# Altium footprint library 3.22-杂项.PcbLib: 199 footprints (part 3 of 15)
Each footprint in its own frame and in the unit in brackets; x right, y up, seen from the top. Pads: shape width x height; smd on the part's side, far side on the other; paste and mask are expansions set on the pad; w line width, h text height; cw(c..) or ccw(c..) is an arc to the next point about the centre after c.
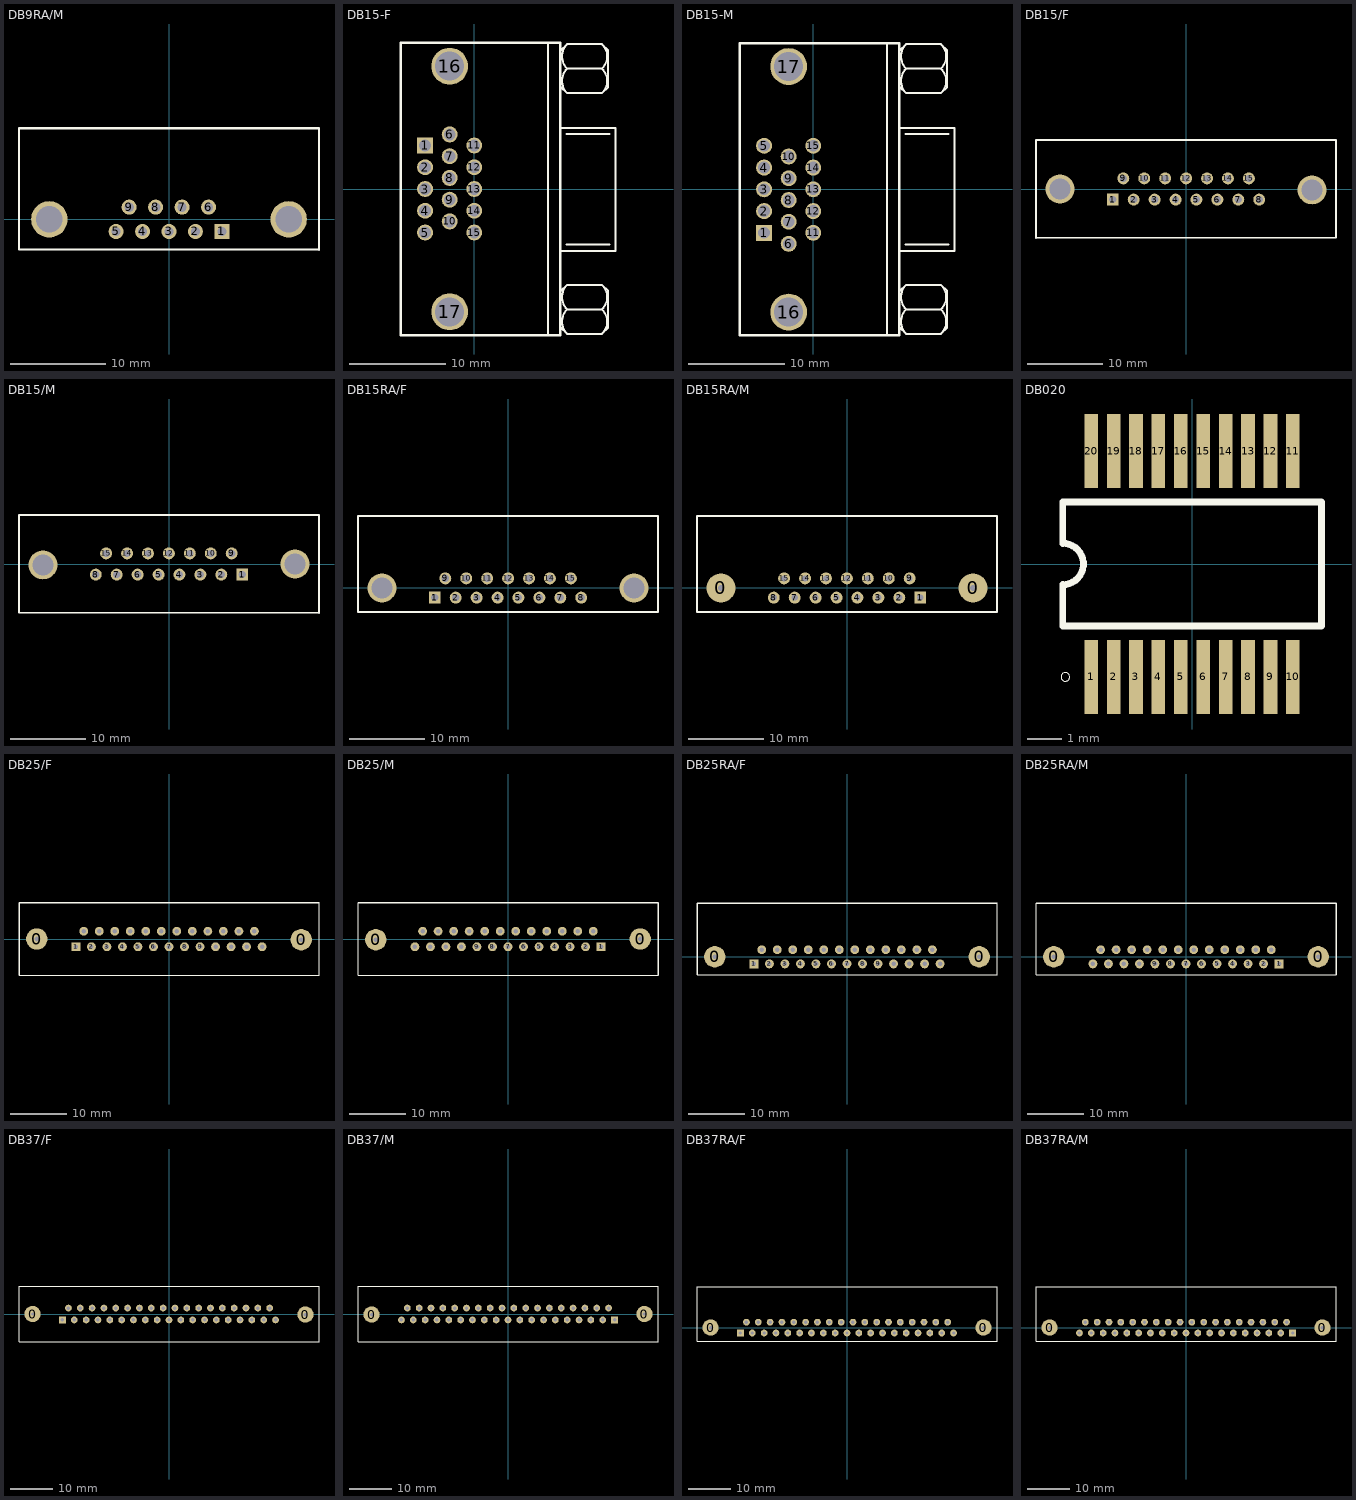
[diagram p2: the footprints below, top view; thin cyan lines are the x and y axes]

## DB9RA/M [mil] "[ PCBѧϰȺ514746572 ]"
pads (11):
  rect 62x62 hole 38: 1(218,-50)
  round 62 hole 38: 2(109,-50) 3(0,-50) 4(-109,-50) 5(-218,-50) 6(163,50) 7(54,50) 8(-55,50) 9(-164,50)
  round 150 hole 110: ""(-493,0) ""(493,0)
Top Overlay:
  lines w8: -618,375 -618,-125 618,-125
  lines w10: -618,375 618,375 618,-125

## DB15-F [mil] "VGAĸ      [ PCBѧϰȺ514746572 ]"
height 393.7
pads (17):
  rect 65x65 hole 48: 1(-200,177.16)
  round 65 hole 48: 2(-200,88.58) 3(-200,0) 4(-200,-88.58) 5(-200,-177.16) 6(-100,222.17) 7(-100,133.58) 8(-100,45) 9(-100,-43.58) 10(-100,-132.16) 11(0,177.16) 12(0,88.58) 13(0,0) 14(0,-88.58) 15(0,-177.16)
  round 150 hole 118.11: 16(-100,500) 17(-100,-500)
Top Overlay:
  lines w8: 300,-595 300,596.25 ; 350,-251.67 575,-251.67 575,248.33 350,248.33 ; 353.33,-565 378.33,-590 520,-590 545,-565 545,-415 520,-390 378.33,-390 353.33,-415 ; 353.33,415 378.33,390 520,390 545,415 545,565 520,590 378.33,590 353.33,565 ; 375,-226.67 550,-226.67 ; 375,223.33 550,223.33 ; 378.25,-590.09 cw(c428.33,-540) 378.25,-489.91 ; 378.25,-490.09 cw(c428.33,-440) 378.25,-389.91 ; 378.25,389.91 cw(c428.33,440) 378.25,490.09 ; 378.25,489.91 cw(c428.33,540) 378.25,590.09 ; 378.33,-490 520,-490 ; 378.33,490 520,490 ; 520.09,-590.09 ccw(c470,-540) 520.09,-489.91 ; 520.09,-490.09 ccw(c470,-440) 520.09,-389.91 ; 520.09,389.91 ccw(c470,440) 520.09,490.09 ; 520.09,489.91 ccw(c470,540) 520.09,590.09
  lines w10: -300,-595 350,-595 350,595 -300,595 -300,-595

## DB15-M [mil] "VGA公      [ PCB学习群514746572 ]"
height 393.7
pads (17):
  rect 65x65 hole 48: 1(-200,-177.16)
  round 65 hole 48: 2(-200,-88.58) 3(-200,0) 4(-200,88.58) 5(-200,177.16) 6(-100,-222) 7(-100,-132.16) 8(-100,-43.58) 9(-100,45) 10(-100,133.58) 11(0,-177.16) 12(0,-88.58) 13(0,0) 14(0,88.58) 15(0,177.16)
  round 150 hole 118.11: 16(-100,-500) 17(-100,500)
Top Overlay:
  lines w8: 300,-596.25 300,595 ; 350,-250.42 575,-250.42 575,249.58 350,249.58 ; 353.33,-563.75 378.33,-588.75 520,-588.75 545,-563.75 545,-413.75 520,-388.75 378.33,-388.75 353.33,-413.75 ; 353.33,416.25 378.33,391.25 520,391.25 545,416.25 545,566.25 520,591.25 378.33,591.25 353.33,566.25 ; 375,-225.42 550,-225.42 ; 375,224.58 550,224.58 ; 378.25,-588.84 cw(c428.33,-538.75) 378.25,-488.66 ; 378.25,-488.84 cw(c428.33,-438.75) 378.25,-388.66 ; 378.25,391.16 cw(c428.33,441.25) 378.25,491.34 ; 378.25,491.16 cw(c428.33,541.25) 378.25,591.34 ; 378.33,-488.75 520,-488.75 ; 378.33,491.25 520,491.25 ; 520.09,-588.84 ccw(c470,-538.75) 520.09,-488.66 ; 520.09,-488.84 ccw(c470,-438.75) 520.09,-388.66 ; 520.09,391.16 ccw(c470,441.25) 520.09,491.34 ; 520.09,491.16 ccw(c470,541.25) 520.09,591.34
  lines w10: -300,-595 -300,595 350,595 350,-595 -300,-595

## DB15/F [mil] "[ PCBѧϰȺ514746572 ]"
pads (17):
  rect 62x62 hole 38: 1(-381.5,-55)
  round 62 hole 38: 2(-272.5,-55) 3(-163.5,-55) 4(-54.5,-55) 5(54.5,-55) 6(163.5,-55) 7(272.5,-55) 8(381.5,-55) 9(-326.5,55) 10(-217.5,55) 11(-108.5,55) 12(0.5,55) 13(109.5,55) 14(218.5,55) 15(327.5,55)
  round 150 hole 110: ""(-656.5,0) ""(656.5,-5)
Top Overlay:
  lines w8: -781.5,-255 781.5,-255 781.5,255
  lines w10: -781.5,-255 -781.5,255 781.5,255

## DB15/M [mil] "[ PCBѧϰȺ514746572 ]"
pads (17):
  rect 62x62 hole 38: 1(381.5,-55)
  round 62 hole 38: 2(272.5,-55) 3(163.5,-55) 4(54.5,-55) 5(-54.5,-55) 6(-163.5,-55) 7(-272.5,-55) 8(-381.5,-55) 9(326.5,55) 10(217.5,55) 11(108.5,55) 12(-0.5,55) 13(-109.5,55) 14(-218.5,55) 15(-327.5,55)
  round 150 hole 110: ""(-656.5,-5) ""(656.5,0)
Top Overlay:
  lines w8: -781.5,255 -781.5,-255 781.5,-255
  lines w10: -781.5,255 781.5,255 781.5,-255

## DB15RA/F [mil] "[ PCBѧϰȺ514746572 ]"
pads (17):
  rect 62x62 hole 38: 1(-381.5,-50)
  round 62 hole 38: 2(-272.5,-50) 3(-163.5,-50) 4(-54.5,-50) 5(54.5,-50) 6(163.5,-50) 7(272.5,-50) 8(381.5,-50) 9(-326.5,50) 10(-217.5,50) 11(-108.5,50) 12(0.5,50) 13(109.5,50) 14(218.5,50) 15(327.5,50)
  round 150 hole 110: ""(-656.5,0) ""(656.5,0)
Top Overlay:
  lines w8: -781.5,-125 781.5,-125 781.5,375
  lines w10: -781.5,-125 -781.5,375 781.5,375

## DB15RA/M [mil] "[ PCBѧϰȺ514746572 ]"
pads (17):
  round 150 hole 32: 0(-656.5,0) 0(656.5,0)
  rect 62x62 hole 32: 1(381.5,-50)
  round 62 hole 32: 2(272.5,-50) 3(163.5,-50) 4(54.5,-50) 5(-54.5,-50) 6(-163.5,-50) 7(-272.5,-50) 8(-381.5,-50) 9(326.5,50) 10(217.5,50) 11(108.5,50) 12(-0.5,50) 13(-109.5,50) 14(-218.5,50) 15(-327.5,50)
Top Overlay:
  lines w8: -781.5,375 -781.5,-125 781.5,-125
  lines w10: -781.5,375 781.5,375 781.5,-125

## DB020 [mm] "Plastic SSOP; 20 Leads; Body Width 5.3 mm; Pitch 0.65 mm      [ PCBѧϰȺ514746572 ]"
height 2
pads (20):
  rect 0.396x2.15 smd: 1(-2.925,-3.275) 2(-2.275,-3.275) 3(-1.625,-3.275) 4(-0.975,-3.275) 5(-0.325,-3.275) 6(0.325,-3.275) 7(0.975,-3.275) 8(1.625,-3.275) 9(2.275,-3.275) 10(2.925,-3.275) 11(2.925,3.275) 12(2.275,3.275) 13(1.625,3.275) 14(0.975,3.275) 15(0.325,3.275) 16(-0.325,3.275) 17(-0.975,3.275) 18(-1.625,3.275) 19(-2.275,3.275) 20(-2.925,3.275)
Top Overlay:
  circle w0.025: c-3.675,-3.275 r0.125
  lines w0.2: -3.75,-1.8 -3.75,-0.6 ccw(c-3.75,0) -3.75,0.6 -3.75,1.8 3.75,1.8 3.75,-1.8 -3.75,-1.8

## DB25/F [mil] "[ PCBѧϰȺ514746572 ]"
pads (27):
  round 150 hole 32: 0(-929,0) 0(929,-5)
  rect 62x62 hole 32: 1(-654,-55)
  round 62 hole 32: 2(-545,-55) 3(-436,-55) 4(-327,-55) 5(-218,-55) 6(-109,-55) 7(0,-55) 8(109,-55) 9(218,-55) 10(327,-55) 11(436,-55) 12(545,-55) 13(654,-55) 14(-599,55) 15(-490,55) 16(-381,55) 17(-272,55) 18(-163,55) 19(-54,55) 20(55,55) 21(164,55) 22(273,55) 23(382,55) 24(491,55) 25(600,55)
Top Overlay:
  lines w8: -1054,-255 1054,-255 1054,255
  lines w10: -1054,-255 -1054,255 1054,255

## DB25/M [mil] "[ PCBѧϰȺ514746572 ]"
pads (27):
  round 150 hole 32: 0(-929,-5) 0(929,0)
  rect 62x62 hole 32: 1(654,-55)
  round 62 hole 32: 2(545,-55) 3(436,-55) 4(327,-55) 5(218,-55) 6(109,-55) 7(0,-55) 8(-109,-55) 9(-218,-55) 10(-327,-55) 11(-436,-55) 12(-545,-55) 13(-654,-55) 14(599,55) 15(490,55) 16(381,55) 17(272,55) 18(163,55) 19(54,55) 20(-55,55) 21(-164,55) 22(-273,55) 23(-382,55) 24(-491,55) 25(-600,55)
Top Overlay:
  lines w8: -1054,255 -1054,-255 1054,-255
  lines w10: -1054,255 1054,255 1054,-255

## DB25RA/F [mil] "[ PCBѧϰȺ514746572 ]"
pads (27):
  round 150 hole 32: 0(-929,0) 0(929,0)
  rect 62x62 hole 32: 1(-654,-50)
  round 62 hole 32: 2(-545,-50) 3(-436,-50) 4(-327,-50) 5(-218,-50) 6(-109,-50) 7(0,-50) 8(109,-50) 9(218,-50) 10(327,-50) 11(436,-50) 12(545,-50) 13(654,-50) 14(-599,50) 15(-490,50) 16(-381,50) 17(-272,50) 18(-163,50) 19(-54,50) 20(55,50) 21(164,50) 22(273,50) 23(382,50) 24(491,50) 25(600,50)
Top Overlay:
  lines w8: -1054,-125 1054,-125 1054,375
  lines w10: -1054,-125 -1054,375 1054,375

## DB25RA/M [mil] "[ PCBѧϰȺ514746572 ]"
pads (27):
  round 150 hole 32: 0(-929,0) 0(929,0)
  rect 62x62 hole 32: 1(654,-50)
  round 62 hole 32: 2(545,-50) 3(436,-50) 4(327,-50) 5(218,-50) 6(109,-50) 7(0,-50) 8(-109,-50) 9(-218,-50) 10(-327,-50) 11(-436,-50) 12(-545,-50) 13(-654,-50) 14(599,50) 15(490,50) 16(381,50) 17(272,50) 18(163,50) 19(54,50) 20(-55,50) 21(-164,50) 22(-273,50) 23(-382,50) 24(-491,50) 25(-600,50)
Top Overlay:
  lines w8: -1054,375 -1054,-125 1054,-125
  lines w10: -1054,375 1054,375 1054,-125

## DB37/F [mil] "[ PCBѧϰȺ514746572 ]"
pads (39):
  round 150 hole 32: 0(-1256,0) 0(1256,-5)
  rect 62x62 hole 32: 1(-981,-55)
  round 62 hole 32: 2(-872,-55) 3(-763,-55) 4(-654,-55) 5(-545,-55) 6(-436,-55) 7(-327,-55) 8(-218,-55) 9(-109,-55) 10(0,-55) 11(109,-55) 12(218,-55) 13(327,-55) 14(436,-55) 15(545,-55) 16(654,-55) 17(763,-55) 18(872,-55) 19(981,-55) 20(-926,55) 21(-817,55) 22(-708,55) 23(-599,55) 24(-490,55) 25(-381,55) 26(-272,55) 27(-163,55) 28(-54,55) 29(55,55) 30(164,55) 31(273,55) 32(382,55) 33(491,55) 34(600,55) 35(709,55) 36(818,55) 37(927,55)
Top Overlay:
  lines w8: -1381,-255 1381,-255 1381,255
  lines w10: -1381,-255 -1381,255 1381,255

## DB37/M [mil] "[ PCBѧϰȺ514746572 ]"
pads (39):
  round 150 hole 32: 0(-1256,-5) 0(1256,0)
  rect 62x62 hole 32: 1(981,-55)
  round 62 hole 32: 2(872,-55) 3(763,-55) 4(654,-55) 5(545,-55) 6(436,-55) 7(327,-55) 8(218,-55) 9(109,-55) 10(0,-55) 11(-109,-55) 12(-218,-55) 13(-327,-55) 14(-436,-55) 15(-545,-55) 16(-654,-55) 17(-763,-55) 18(-872,-55) 19(-981,-55) 20(926,55) 21(817,55) 22(708,55) 23(599,55) 24(490,55) 25(381,55) 26(272,55) 27(163,55) 28(54,55) 29(-55,55) 30(-164,55) 31(-273,55) 32(-382,55) 33(-491,55) 34(-600,55) 35(-709,55) 36(-818,55) 37(-927,55)
Top Overlay:
  lines w8: -1381,255 -1381,-255 1381,-255
  lines w10: -1381,255 1381,255 1381,-255

## DB37RA/F [mil] "[ PCBѧϰȺ514746572 ]"
pads (39):
  round 150 hole 32: 0(-1256,0) 0(1256,0)
  rect 62x62 hole 32: 1(-981,-50)
  round 62 hole 32: 2(-872,-50) 3(-763,-50) 4(-654,-50) 5(-545,-50) 6(-436,-50) 7(-327,-50) 8(-218,-50) 9(-109,-50) 10(0,-50) 11(109,-50) 12(218,-50) 13(327,-50) 14(436,-50) 15(545,-50) 16(654,-50) 17(763,-50) 18(872,-50) 19(981,-50) 20(-926,50) 21(-817,50) 22(-708,50) 23(-599,50) 24(-490,50) 25(-381,50) 26(-272,50) 27(-163,50) 28(-54,50) 29(55,50) 30(164,50) 31(273,50) 32(382,50) 33(491,50) 34(600,50) 35(709,50) 36(818,50) 37(927,50)
Top Overlay:
  lines w8: -1381,-125 1381,-125 1381,375
  lines w10: -1381,-125 -1381,375 1381,375

## DB37RA/M [mil] "[ PCBѧϰȺ514746572 ]"
pads (39):
  round 150 hole 32: 0(-1256,0) 0(1256,0)
  rect 62x62 hole 32: 1(981,-50)
  round 62 hole 32: 2(872,-50) 3(763,-50) 4(654,-50) 5(545,-50) 6(436,-50) 7(327,-50) 8(218,-50) 9(109,-50) 10(0,-50) 11(-109,-50) 12(-218,-50) 13(-327,-50) 14(-436,-50) 15(-545,-50) 16(-654,-50) 17(-763,-50) 18(-872,-50) 19(-981,-50) 20(926,50) 21(817,50) 22(708,50) 23(599,50) 24(490,50) 25(381,50) 26(272,50) 27(163,50) 28(54,50) 29(-55,50) 30(-164,50) 31(-273,50) 32(-382,50) 33(-491,50) 34(-600,50) 35(-709,50) 36(-818,50) 37(-927,50)
Top Overlay:
  lines w8: -1381,375 -1381,-125 1381,-125
  lines w10: -1381,375 1381,375 1381,-125